# Altium schematic symbol library 13-Logicold 逻辑 IC.SchLib: 297 symbols (part 7 of 30)
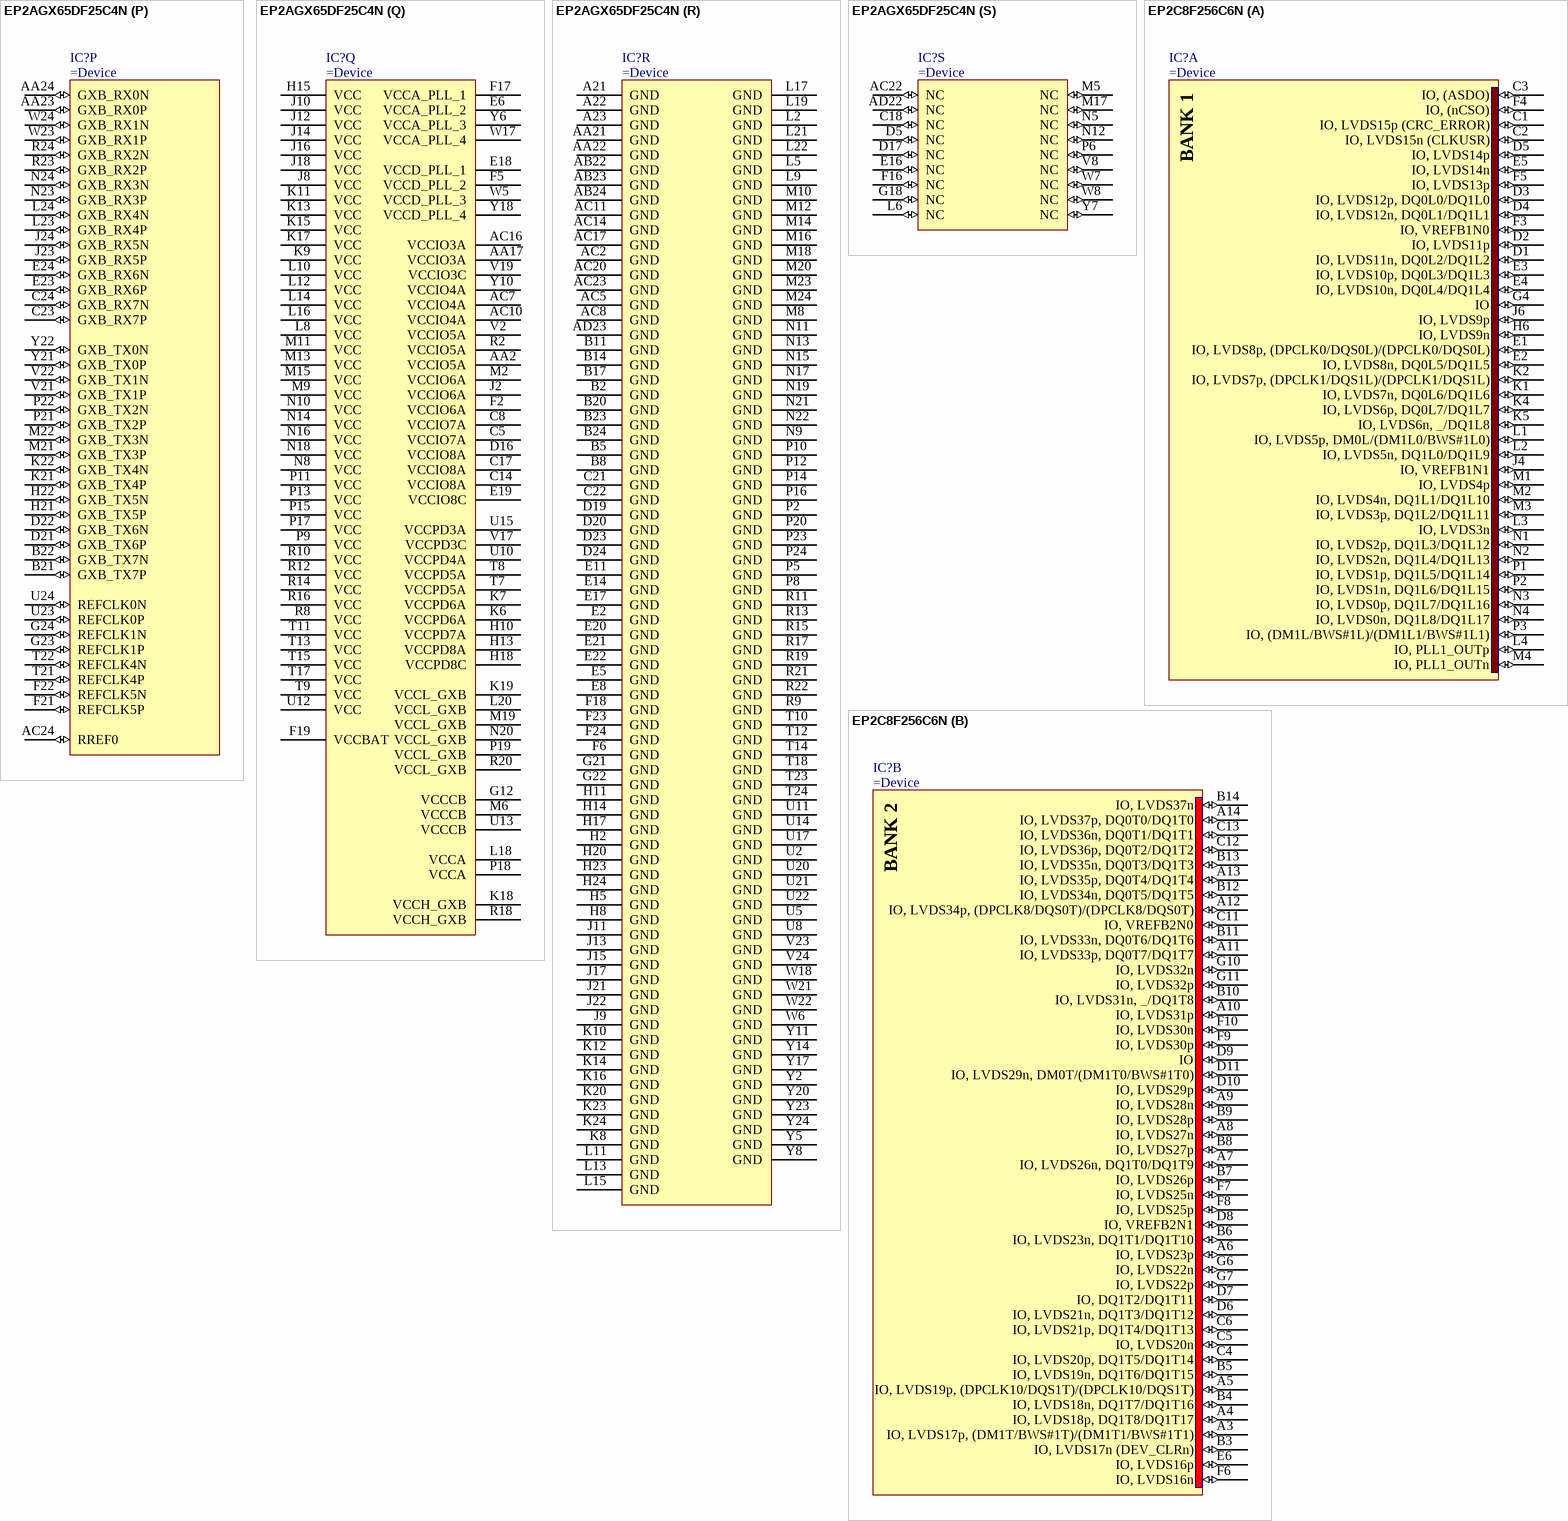
[diagram p168: symbols EP2AGX65DF25C4N to EP2C8F256C6N]

## EP2AGX65DF25C4N
designator IC?
part A pins: AA15 IO/DQ7B/DIFFIO_RX_B4N/DIFFOUT_B4N (io), AA18 IO/DIFFIO_RX_B3P/DIFFOUT_B3P (io), AA19 IO/DIFFIO_RX_B2P/DIFFOUT_B2P/NCEO (io), AB17 IO/DQS7B/DIFFIO_TX_B3P/DIFFIN_B3P (io), AB18 IO/DQ7B/DIFFIO_RX_B3N/DIFFOUT_B3N (io), AB19 IO/DQ8B/DIFFIO_RX_B2N/DIFFOUT_B2N (io), AB21 IO/DQ8B/DIFFIO_TX_B1P/DIFFIN_B1P (io), AC18 IO/DQSN7B/DIFFIO_TX_B3N/DIFFIN_B3N (io), AC21 IO/DQ8B/DIFFIO_TX_B1N/DIFFIN_B1N (io), AD20 IO/DIFFIO_RX_B1P/DIFFOUT_B1P/INIT_DONE (io), AD21 IO/DQ8B/DIFFIO_RX_B1N/DIFFOUT_B1N (io), U16 IO/DQS8B/DIFFIO_TX_B2P/DIFFIN_B2P (io), V15 IO/DIFFIO_TX_B4P/DIFFIN_B4P (io), V16 IO/DQSN8B/DIFFIO_TX_B2N/DIFFIN_B2N (io), W15 IO/DQ7B/DIFFIO_TX_B4N/DIFFIN_B4N (io), Y15 IO/DQ7B/DIFFIO_RX_B4P/DIFFOUT_B4P (io)
part B pins: AA14 IO/DQS5B/DIFFIO_TX_B11P/DIFFIN_B11P (io), AA16 IO/DQ6B/DIFFIO_TX_B9P/DIFFIN_B9P (io), AB14 IO/DQSN5B/DIFFIO_TX_B11N/DIFFIN_B11N (io), AB15 IO/DIFFIO_RX_B11P/DIFFOUT_B11P (io), AB16 IO/DQ6B/DIFFIO_TX_B9N/DIFFIN_B9N (io), AC15 IO/DQ5B/DIFFIO_RX_B11N/DIFFOUT_B11N (io), AC19 IO/DIFFIO_RX_B9P/DIFFOUT_B9P (io), AD15 IO/DQ5B/DIFFIO_RX_B12P/DIFFOUT_B12P (io), AD16 IO/DQ5B/DIFFIO_RX_B12N/DIFFOUT_B12N (io), AD17 IO/DIFFIO_RX_B10P/DIFFOUT_B10P (io), AD18 IO/DQ6B/DIFFIO_RX_B10N/DIFFOUT_B10N (io), AD19 IO/DQ6B/DIFFIO_RX_B9N/DIFFOUT_B9N (io), V13 IO/DIFFIO_TX_B12P/DIFFIN_B12P (io), V14 IO/DQS6B/DIFFIO_TX_B10P/DIFFIN_B10P (io), W13 IO/DQ5B/DIFFIO_TX_B12N/DIFFIN_B12N (io), W14 IO/DQSN6B/DIFFIO_TX_B10N/DIFFIN_B10N (io)
part C pins: AA11 IO/DQS3B/DIFFIO_TX_B15P/DIFFIN_B15P (io), AA12 IO/DQ3B/DIFFIO_RX_B15N/DIFFOUT_B15N (io), AB11 IO/DQSN3B/DIFFIO_TX_B15N/DIFFIN_B15N (io), AB12 IO/DIFFIO_RX_B13P/DIFFOUT_B13P (io), AB13 IO/DQ4B/DIFFIO_TX_B13P/DIFFIN_B13P (io), AC12 IO/DQ4B/DIFFIO_RX_B13N/DIFFOUT_B13N (io), AC13 IO/DQ4B/DIFFIO_TX_B13N/DIFFIN_B13N (io), AD9 IO/DQ3B/DIFFIO_RX_B16P/DIFFOUT_B16P (io), AD10 IO/DQ3B/DIFFIO_RX_B16N/DIFFOUT_B16N (io), AD11 IO/DIFFIO_RX_B14P/DIFFOUT_B14P (io), AD12 IO/DQ4B/DIFFIO_RX_B14N/DIFFOUT_B14N (io), V11 IO/DIFFIO_TX_B16P/DIFFIN_B16P (io), V12 IO/DQS4B/DIFFIO_TX_B14P/DIFFIN_B14P (io), W11 IO/DQ3B/DIFFIO_TX_B16N/DIFFIN_B16N (io), W12 IO/DQSN4B/DIFFIO_TX_B14N/DIFFIN_B14N (io), Y12 IO/DIFFIO_RX_B15P/DIFFOUT_B15P (io)
part D pins: AA6 IO/DIFFIO_RX_B29P/DIFFOUT_B29P (io), AA7 IO/DQS1B/DIFFIO_TX_B23P/DIFFIN_B23P (io), AA8 IO/DIFFIO_RX_B23P/DIFFOUT_B23P (io), AA10 IO/DQ2B/DIFFIO_TX_B21P/DIFFIN_B21P (io), AB6 IO/DIFFIO_RX_B29N/DIFFOUT_B29N (io), AB7 IO/DQSN1B/DIFFIO_TX_B23N/DIFFIN_B23N (io), AB8 IO/DQ1B/DIFFIO_RX_B23N/DIFFOUT_B23N (io), AB9 IO/DIFFIO_RX_B21P/DIFFOUT_B21P (io), AB10 IO/DQ2B/DIFFIO_TX_B21N/DIFFIN_B21N (io), AC6 IO/DQ1B/DIFFIO_RX_B24P/DIFFOUT_B24P (io), AC9 IO/DQ2B/DIFFIO_RX_B21N/DIFFOUT_B21N (io), AD6 IO/DQ1B/DIFFIO_RX_B24N/DIFFOUT_B24N (io), AD7 IO/DIFFIO_RX_B22P/DIFFOUT_B22P (io), AD8 IO/DQ2B/DIFFIO_RX_B22N/DIFFOUT_B22N (io), U9 IO/DIFFIO_TX_B24P/DIFFIN_B24P (io), V9 IO/DQ1B/DIFFIO_TX_B24N/DIFFIN_B24N (io), W9 IO/DQS2B/DIFFIO_TX_B22P/DIFFIN_B22P (io), W10 IO/DQSN2B/DIFFIO_TX_B22N/DIFFIN_B22N (io)
part E pins: AA4 IO/DQS11R/DIFFIO_TX_R3P/DIFFIN_R3P (io), AA5 IO/DIFFIO_RX_R1P/DIFFOUT_R1P (io), AB4 IO/DQSN11R/DIFFIO_TX_R3N/DIFFIN_R3N (io), AB5 IO/DQ12R/DIFFIO_RX_R1N/DIFFOUT_R1N (io), AC3 IO/DQ11R/DIFFIO_RX_R4P/DIFFOUT_R4P (io), AC4 IO/DQ11R/DIFFIO_RX_R4N/DIFFOUT_R4N (io), AD4 IO/DQ12R/DIFFIO_TX_R1P/DIFFIN_R1P (io), AD5 IO/DQ12R/DIFFIO_TX_R1N/DIFFIN_R1N (io), T6 IO/DIFFIO_TX_R4P/DIFFIN_R4P (io), U6 IO/DQ11R/DIFFIO_TX_R4N/DIFFIN_R4N (io), V4 IO/DQ12R/DIFFIO_RX_R2N/DIFFOUT_R2N (io), V5 IO/DIFFIO_RX_R2P/DIFFOUT_R2P (io), V6 IO/DQS12R/DIFFIO_TX_R2P/DIFFIN_R2P (io), V7 IO/DQSN12R/DIFFIO_TX_R2N/DIFFIN_R2N (io), W4 IO/DIFFIO_RX_R3P/DIFFOUT_R3P (io), Y4 IO/DQ11R/DIFFIO_RX_R3N/DIFFOUT_R3N (io)
part F pins: AA1 IO/DQ8R/DIFFIO_TX_R13P/DIFFIN_R13P (io), AA3 IO/DIFFIO_RX_R11P/DIFFOUT_R11P (io), AB1 IO/DQ8R/DIFFIO_TX_R13N/DIFFIN_R13N (io), AB2 IO/DQ9R/DIFFIO_RX_R12P/DIFFOUT_R12P (io), AB3 IO/DQ9R/DIFFIO_RX_R11N/DIFFOUT_R11N (io), AC1 IO/DQ9R/DIFFIO_RX_R12N/DIFFOUT_R12N (io), AD2 IO/DQ10R/DIFFIO_TX_R9P/DIFFIN_R9P (io), AD3 IO/DQ10R/DIFFIO_TX_R9N/DIFFIN_R9N (io), N6 IO/DQ7R/DIFFIO_TX_R16N/DIFFIN_R16N (io), N7 IO/DIFFIO_TX_R16P/DIFFIN_R16P (io), P7 IO/DQS8R/DIFFIO_TX_R14P/DIFFIN_R14P (io), R1 IO/DQ7R/DIFFIO_RX_R16P/DIFFOUT_R16P (io), R3 IO/DQ8R/DIFFIO_RX_R14N/DIFFOUT_R14N (io), R4 IO/DIFFIO_RX_R14P/DIFFOUT_R14P (io), R5 IO/DQ9R/DIFFIO_TX_R12N/DIFFIN_R12N (io), R6 IO/DIFFIO_TX_R12P/DIFFIN_R12P (io), R7 IO/DQSN8R/DIFFIO_TX_R14N/DIFFIN_R14N (io), T1 IO/DQ7R/DIFFIO_RX_R16N/DIFFOUT_R16N (io), T2 IO/DQ8R/DIFFIO_RX_R13N/DIFFOUT_R13N (io), T3 IO/DIFFIO_RX_R13P/DIFFOUT_R13P (io), T4 IO/DQSN10R/DIFFIO_TX_R10N/DIFFIN_R10N (io), T5 IO/DQS10R/DIFFIO_TX_R10P/DIFFIN_R10P (io), U1 IO/DQS7R/DIFFIO_TX_R15P/DIFFIN_R15P (io), U3 IO/DQ10R/DIFFIO_RX_R9N/DIFFOUT_R9N (io), U4 IO/DIFFIO_RX_R9P/DIFFOUT_R9P (io), V1 IO/DQSN7R/DIFFIO_TX_R15N/DIFFIN_R15N (io), V3 IO/DQS9R/DIFFIO_TX_R11P/DIFFIN_R11P (io), W1 IO/DIFFIO_RX_R15P/DIFFOUT_R15P (io), W2 IO/DQSN9R/DIFFIO_TX_R11N/DIFFIN_R11N (io), W3 IO/DIFFIO_RX_R10P/DIFFOUT_R10P (io), Y1 IO/DQ7R/DIFFIO_RX_R15N/DIFFOUT_R15N (io), Y3 IO/DQ10R/DIFFIO_RX_R10N/DIFFOUT_R10N (io)
part G pins: E1 IO/DQS3R/DIFFIO_TX_R23P/DIFFIN_R23P (io), F1 IO/DQSN3R/DIFFIO_TX_R23N/DIFFIN_R23N (io), F3 IO/DQ3R/DIFFIO_RX_R24P/DIFFOUT_R24P (io), G1 IO/DQ4R/DIFFIO_RX_R22N/DIFFOUT_R22N (io), G2 IO/DIFFIO_RX_R22P/DIFFOUT_R22P (io), G3 IO/DQ3R/DIFFIO_RX_R24N/DIFFOUT_R24N (io), H1 IO/DQ4R/DIFFIO_TX_R21P/DIFFIN_R21P (io), H3 IO/DQ3R/DIFFIO_RX_R23N/DIFFOUT_R23N (io), H4 IO/DIFFIO_RX_R23P/DIFFOUT_R23P (io), H6 IO/DQ3R/DIFFIO_TX_R24N/DIFFIN_R24N (io), H7 IO/DIFFIO_TX_R24P/DIFFIN_R24P (io), J1 IO/DQ4R/DIFFIO_TX_R21N/DIFFIN_R21N (io), J3 IO/DQ4R/DIFFIO_RX_R21N/DIFFOUT_R21N (io), J4 IO/DIFFIO_RX_R21P/DIFFOUT_R21P (io), J5 IO/DQSN4R/DIFFIO_TX_R22N/DIFFIN_R22N (io), J6 IO/DQS4R/DIFFIO_TX_R22P/DIFFIN_R22P (io), K1 IO/DQS5R/DIFFIO_TX_R19P/DIFFIN_R19P (io), K2 IO/DQ5R/DIFFIO_RX_R20N/DIFFOUT_R20N (io), K3 IO/DQ5R/DIFFIO_RX_R20P/DIFFOUT_R20P (io), K4 IO/DQ5R/DIFFIO_TX_R20N/DIFFIN_R20N (io), K5 IO/DIFFIO_TX_R20P/DIFFIN_R20P (io), L1 IO/DQSN5R/DIFFIO_TX_R19N/DIFFIN_R19N (io), L3 IO/DQ5R/DIFFIO_RX_R19N/DIFFOUT_R19N (io), L4 IO/DIFFIO_RX_R19P/DIFFOUT_R19P (io), L7 IO/DQS6R/DIFFIO_TX_R18P/DIFFIN_R18P (io), M1 IO/DQ6R/DIFFIO_RX_R18N/DIFFOUT_R18N (io), M3 IO/DQ6R/DIFFIO_RX_R17N/DIFFOUT_R17N (io), M4 IO/DIFFIO_RX_R17P/DIFFOUT_R17P (io), M7 IO/DQSN6R/DIFFIO_TX_R18N/DIFFIN_R18N (io), N1 IO/DQ6R/DIFFIO_TX_R17P/DIFFIN_R17P (io), N2 IO/DIFFIO_RX_R18P/DIFFOUT_R18P (io), P1 IO/DQ6R/DIFFIO_TX_R17N/DIFFIN_R17N (io)
part H pins: B1 IO/DQ1R/DIFFIO_RX_R32P/DIFFOUT_R32P (io), C1 IO/DQ1R/DIFFIO_RX_R32N/DIFFOUT_R32N (io), C2 IO/DQSN1R/DIFFIO_TX_R31N/DIFFIN_R31N (io), C3 IO/DQS1R/DIFFIO_TX_R31P/DIFFIN_R31P (io), D1 IO/DQ2R/DIFFIO_TX_R29N/DIFFIN_R29N/DATA7 (io), D2 IO/DQ2R/DIFFIO_TX_R29P/DIFFIN_R29P/DATA5 (io), D3 IO/DIFFIO_RX_R29P/DIFFOUT_R29P/DATA4 (io), D4 IO/DIFFIO_RX_R31P/DIFFOUT_R31P/DEV_OE (io), E3 IO/DQ2R/DIFFIO_RX_R29N/DIFFOUT_R29N/DATA6 (io), E4 IO/DQ1R/DIFFIO_RX_R31N/DIFFOUT_R31N (io), F4 IO/DIFFIO_RX_R30P/DIFFOUT_R30P/CLKUSR (io), F7 IO/DIFFIO_TX_R32P/DIFFIN_R32P/DEV_CLRN (io), G4 IO/DQ2R/DIFFIO_RX_R30N/DIFFOUT_R30N/DATA2 (io), G5 IO/DQSN2R/DIFFIO_TX_R30N/DIFFIN_R30N/DATA3 (io), G6 IO/DQS2R/DIFFIO_TX_R30P/DIFFIN_R30P/DATA1 (io), G7 IO/DQ1R/DIFFIO_TX_R32N/DIFFIN_R32N (io)
part I pins: A2 IO/DQ7T/DIFFIO_RX_T7N/DIFFOUT_T7N (io), A3 IO/DIFFIO_RX_T7P/DIFFOUT_T7P (io), A4 IO/DQ8T/DIFFIO_RX_T6N/DIFFOUT_T6N (io), A5 IO/DQ7T/DIFFIO_TX_T8N/DIFFIN_T8N (io), A6 IO/DQ7T/DIFFIO_TX_T8P/DIFFIN_T8P (io), B3 IO/DIFFIO_RX_T6P/DIFFOUT_T6P (io), B4 IO/DQSN8T/DIFFIO_TX_T6N/DIFFIN_T6N (io), C4 IO/DQS8T/DIFFIO_TX_T6P/DIFFIN_T6P (io), C6 IO/DQ8T/DIFFIO_RX_T5N/DIFFOUT_T5N (io), C7 IO/DQ7T/DIFFIO_RX_T8N/DIFFOUT_T8N (io), D6 IO/DQ8T/DIFFIO_RX_T5P/DIFFOUT_T5P (io), D8 IO/DIFFIO_RX_T8P/DIFFOUT_T8P (io), E9 IO/DQSN7T/DIFFIO_TX_T7N/DIFFIN_T7N (io), F9 IO/DQS7T/DIFFIO_TX_T7P/DIFFIN_T7P (io), G9 IO/DQ8T/DIFFIO_TX_T5N/DIFFIN_T5N (io), H9 IO/DIFFIO_TX_T5P/DIFFIN_T5P (io)
part J pins: A7 IO/DQ6T/DIFFIO_RX_T14N/DIFFOUT_T14N (io), A8 IO/DIFFIO_RX_T14P/DIFFOUT_T14P (io), A9 IO/DQ5T/DIFFIO_RX_T16N/DIFFOUT_T16N (io), A10 IO/DQ5T/DIFFIO_TX_T16N/DIFFIN_T16N (io), B6 IO/DQSN6T/DIFFIO_TX_T14N/DIFFIN_T14N (io), B7 IO/DQS6T/DIFFIO_TX_T14P/DIFFIN_T14P (io), B9 IO/DIFFIO_RX_T16P/DIFFOUT_T16P (io), B10 IO/DQ5T/DIFFIO_TX_T16P/DIFFIN_T16P (io), C9 IO/DQ6T/DIFFIO_RX_T13N/DIFFOUT_T13N (io), C10 IO/DQ5T/DIFFIO_RX_T15N/DIFFOUT_T15N (io), D9 IO/DQ6T/DIFFIO_RX_T13P/DIFFOUT_T13P (io), D10 IO/DIFFIO_RX_T15P/DIFFOUT_T15P (io), E10 IO/DQSN5T/DIFFIO_TX_T15N/DIFFIN_T15N (io), F10 IO/DQS5T/DIFFIO_TX_T15P/DIFFIN_T15P (io), G10 IO/DQ6T/DIFFIO_TX_T13N/DIFFIN_T13N (io), G11 IO/DIFFIO_TX_T13P/DIFFIN_T13P (io)
part K pins: A11 IO/DQSN4T/DIFFIO_TX_T18N/DIFFIN_T18N (io), A12 IO/DQS4T/DIFFIO_TX_T18P/DIFFIN_T18P (io), A13 IO/DQ3T/DIFFIO_RX_T19N/DIFFOUT_T19N (io), A14 IO/DQ3T/DIFFIO_TX_T20N/DIFFIN_T20N (io), B12 IO/DQ4T/DIFFIO_RX_T18N/DIFFOUT_T18N (io), B13 IO/DIFFIO_RX_T19P/DIFFOUT_T19P (io), B15 IO/DQ3T/DIFFIO_TX_T20P/DIFFIN_T20P (io), C12 IO/DIFFIO_RX_T18P/DIFFOUT_T18P (io), C13 IO/DQ3T/DIFFIO_RX_T20N/DIFFOUT_T20N (io), D12 IO/DQ4T/DIFFIO_RX_T17N/DIFFOUT_T17N (io), D13 IO/DQ4T/DIFFIO_TX_T17N/DIFFIN_T17N (io), D14 IO/DIFFIO_RX_T20P/DIFFOUT_T20P (io), E12 IO/DQ4T/DIFFIO_RX_T17P/DIFFOUT_T17P (io), E13 IO/DIFFIO_TX_T17P/DIFFIN_T17P (io), F13 IO/DQSN3T/DIFFIO_TX_T19N/DIFFIN_T19N (io), G13 IO/DQS3T/DIFFIO_TX_T19P/DIFFIN_T19P (io)
part L pins: A15 IO/DQSN2T/DIFFIO_TX_T26N/DIFFIN_T26N (io), A16 IO/DQS2T/DIFFIO_TX_T26P/DIFFIN_T26P (io), A17 IO/DQ1T/DIFFIO_RX_T27N/DIFFOUT_T27N (io), A18 IO/DIFFIO_RX_T27P/DIFFOUT_T27P (io), A19 IO/DQ1T/DIFFIO_TX_T28N/DIFFIN_T28N (io), A20 IO/DQ1T/DIFFIO_TX_T28P/DIFFIN_T28P (io), B16 IO/DQ2T/DIFFIO_RX_T26N/DIFFOUT_T26N (io), B18 IO/DQ1T/DIFFIO_RX_T28N/DIFFOUT_T28N (io), C15 IO/DQ2T/DIFFIO_RX_T25N/DIFFOUT_T25N (io), C16 IO/DIFFIO_RX_T26P/DIFFOUT_T26P (io), C19 IO/DIFFIO_RX_T28P/DIFFOUT_T28P/CRC_ERROR (io), D15 IO/DQ2T/DIFFIO_RX_T25P/DIFFOUT_T25P (io), E15 IO/DQSN1T/DIFFIO_TX_T27N/DIFFIN_T27N (io), F14 IO/DQ2T/DIFFIO_TX_T25N/DIFFIN_T25N (io), F15 IO/DQS1T/DIFFIO_TX_T27P/DIFFIN_T27P (io), G14 IO/DIFFIO_TX_T25P/DIFFIN_T25P (io)
part M pins: AA13 CLK4_DIFFCLK_0N (io), AD13 CLK7_DIFFCLK_1P (io), AD14 CLK5_DIFFCLK_1N (io), C11 CLK14_DIFFCLK_4N (io), D11 CLK12_DIFFCLK_4P (io), F11 CLK15_DIFFCLK_5N (io), F12 CLK13_DIFFCLK_5P (io), G15 VREFB8AN0 (io), H12 VREFB7AN0 (io), J7 VREFB6AN0 (io), N3 CLK9_DIFFCLK_3N (io), N4 CLK11_DIFFCLK_3P (io), P3 CLK8_DIFFCLK_2N (io), P4 CLK10_DIFFCLK_2P (io), T16 VREFB3AN0 (io), U7 VREFB5AN0 (io), V10 VREFB4AN0 (io), Y13 CLK6_DIFFCLK_0P (io)
part N pins: D18 TCK (io), F20 DCLK (io), G17 TMS (io), G19 TDI (io), G20 TDO (io), H19 NCSO (io), J19 DATA0 (io), J20 ASDO (io), T19 MSEL1 (io), T20 MSEL3 (io), U18 NSTATUS (io), U19 NIO_PULLUP (io), V18 NCE (io), V20 NCONFIG (io), W19 CONF_DONE (io), W20 MSEL2 (io), Y19 MSEL0 (io)
part O pins: AA9 PLL3_CLKOUT1N (io), AA20 RUP0 (io), AB20 RDN0 (io), B19 RDN2 (io), C20 RUP2 (io), D7 RDN1 (io), E7 RUP1 (io), F8 PLL2_CLKOUT1N (io), G8 PLL2_CLKOUT1P (io), G16 PLL1_CLKOUT1N (io), H16 PLL1_CLKOUT1P (io), W16 PLL4_CLKOUT1P (io), Y9 PLL3_CLKOUT1P (io), Y16 PLL4_CLKOUT1N (io)
part P pins: AA23 GXB_RX0P (io), AA24 GXB_RX0N (io), AC24 RREF0 (io), B21 GXB_TX7P (io), B22 GXB_TX7N (io), C23 GXB_RX7P (io), C24 GXB_RX7N (io), D21 GXB_TX6P (io), D22 GXB_TX6N (io), E23 GXB_RX6P (io), E24 GXB_RX6N (io), F21 REFCLK5P (io), F22 REFCLK5N (io), G23 REFCLK1P (io), G24 REFCLK1N (io), H21 GXB_TX5P (io), H22 GXB_TX5N (io), J23 GXB_RX5P (io), J24 GXB_RX5N (io), K21 GXB_TX4P (io), K22 GXB_TX4N (io), L23 GXB_RX4P (io), L24 GXB_RX4N (io), M21 GXB_TX3P (io), M22 GXB_TX3N (io), N23 GXB_RX3P (io), N24 GXB_RX3N (io), P21 GXB_TX2P (io), P22 GXB_TX2N (io), R23 GXB_RX2P (io), R24 GXB_RX2N (io), T21 REFCLK4P (io), T22 REFCLK4N (io), U23 REFCLK0P (io), U24 REFCLK0N (io), V21 GXB_TX1P (io), V22 GXB_TX1N (io), W23 GXB_RX1P (io), W24 GXB_RX1N (io), Y21 GXB_TX0P (io), Y22 GXB_TX0N (io)
part Q pins: AA2 VCCIO5A (power), AA17 VCCIO3A (power), AC7 VCCIO4A (power), AC10 VCCIO4A (power), AC16 VCCIO3A (power), C5 VCCIO7A (power), C8 VCCIO7A (power), C14 VCCIO8A (power), C17 VCCIO8A (power), D16 VCCIO8A (power), E6 VCCA_PLL_2 (power), E18 VCCD_PLL_1 (power), E19 VCCIO8C (power), F2 VCCIO6A (power), F5 VCCD_PLL_2 (power), F17 VCCA_PLL_1 (power), F19 VCCBAT (power), G12 VCCCB (power), H10 VCCPD7A (power), H13 VCCPD8A (power), H15 VCC (power), H18 VCCPD8C (power), J2 VCCIO6A (power), J8 VCC (power), J10 VCC (power), J12 VCC (power), J14 VCC (power), J16 VCC (power), J18 VCC (power), K6 VCCPD6A (power), K7 VCCPD6A (power), K9 VCC (power), K11 VCC (power), K13 VCC (power), K15 VCC (power), K17 VCC (power), K18 VCCH_GXB (power), K19 VCCL_GXB (power), L8 VCC (power), L10 VCC (power), L12 VCC (power), L14 VCC (power), L16 VCC (power), L18 VCCA (power), L20 VCCL_GXB (power), M2 VCCIO6A (power), M6 VCCCB (power), M9 VCC (power), M11 VCC (power), M13 VCC (power), M15 VCC (power), M19 VCCL_GXB (power), N8 VCC (power), N10 VCC (power), N14 VCC (power), N16 VCC (power), N18 VCC (power), N20 VCCL_GXB (power), P9 VCC (power), P11 VCC (power), P13 VCC (power), P15 VCC (power), P17 VCC (power), P18 VCCA (power), P19 VCCL_GXB (power), R2 VCCIO5A (power), R8 VCC (power), R10 VCC (power), R12 VCC (power), R14 VCC (power), R16 VCC (power), R18 VCCH_GXB (power), R20 VCCL_GXB (power), T7 VCCPD5A (power), T8 VCCPD5A (power), T9 VCC (power), T11 VCC (power), T13 VCC (power), T15 VCC (power), T17 VCC (power), U10 VCCPD4A (power), U12 VCC (power), U13 VCCCB (power), U15 VCCPD3A (power), V2 VCCIO5A (power), V17 VCCPD3C (power), V19 VCCIO3C (power), W5 VCCD_PLL_3 (power), W17 VCCA_PLL_4 (power), Y6 VCCA_PLL_3 (power), Y10 VCCIO4A (power), Y18 VCCD_PLL_4 (power)
part R pins: A21 GND (power), A22 GND (power), A23 GND (power), AA21 GND (power), AA22 GND (power), AB22 GND (power), AB23 GND (power), AB24 GND (power), AC2 GND (power), AC5 GND (power), AC8 GND (power), AC11 GND (power), AC14 GND (power), AC17 GND (power), AC20 GND (power), AC23 GND (power), AD23 GND (power), B2 GND (power), B5 GND (power), B8 GND (power), B11 GND (power), B14 GND (power), B17 GND (power), B20 GND (power), B23 GND (power), B24 GND (power), C21 GND (power), C22 GND (power), D19 GND (power), D20 GND (power), D23 GND (power), D24 GND (power), E2 GND (power), E5 GND (power), E8 GND (power), E11 GND (power), E14 GND (power), E17 GND (power), E20 GND (power), E21 GND (power), E22 GND (power), F6 GND (power), F18 GND (power), F23 GND (power), F24 GND (power), G21 GND (power), G22 GND (power), H2 GND (power), H5 GND (power), H8 GND (power), H11 GND (power), H14 GND (power), H17 GND (power), H20 GND (power), H23 GND (power), H24 GND (power), J9 GND (power), J11 GND (power), J13 GND (power), J15 GND (power), J17 GND (power), J21 GND (power), J22 GND (power), K8 GND (power), K10 GND (power), K12 GND (power), K14 GND (power), K16 GND (power), K20 GND (power), K23 GND (power), K24 GND (power), L2 GND (power), L5 GND (power), L9 GND (power), L11 GND (power), L13 GND (power), L15 GND (power), L17 GND (power), L19 GND (power), L21 GND (power), L22 GND (power), M8 GND (power), M10 GND (power), M12 GND (power), M14 GND (power), M16 GND (power), M18 GND (power), M20 GND (power), M23 GND (power), M24 GND (power), N9 GND (power), N11 GND (power), N13 GND (power), N15 GND (power), N17 GND (power), N19 GND (power), N21 GND (power), N22 GND (power), P2 GND (power), P5 GND (power), P8 GND (power), P10 GND (power), P12 GND (power), P14 GND (power), P16 GND (power), P20 GND (power), P23 GND (power), P24 GND (power), R9 GND (power), R11 GND (power), R13 GND (power), R15 GND (power), R17 GND (power), R19 GND (power), R21 GND (power), R22 GND (power), T10 GND (power), T12 GND (power), T14 GND (power), T18 GND (power), T23 GND (power), T24 GND (power), U2 GND (power), U5 GND (power), U8 GND (power), U11 GND (power), U14 GND (power), U17 GND (power), U20 GND (power), U21 GND (power), U22 GND (power), V23 GND (power), V24 GND (power), W6 GND (power), W18 GND (power), W21 GND (power), W22 GND (power), Y2 GND (power), Y5 GND (power), Y8 GND (power), Y11 GND (power), Y14 GND (power), Y17 GND (power), Y20 GND (power), Y23 GND (power), Y24 GND (power)
part S pins: AC22 NC (io), AD22 NC (io), C18 NC (io), D5 NC (io), D17 NC (io), E16 NC (io), F16 NC (io), G18 NC (io), L6 NC (io), M5 NC (io), M17 NC (io), N5 NC (io), N12 NC (io), P6 NC (io), V8 NC (io), W7 NC (io), W8 NC (io), Y7 NC (io)
part A text: BANK 3A
part B text: BANK 3A
part C text: BANK 4A
part D text: BANK 4A
part E text: BANK 5A
part F text: BANK 5A
part G text: BANK 6A
part H text: BANK 6A
part I text: BANK 7A
part J text: BANK 7A
part K text: BANK 8A
part L text: BANK 8A

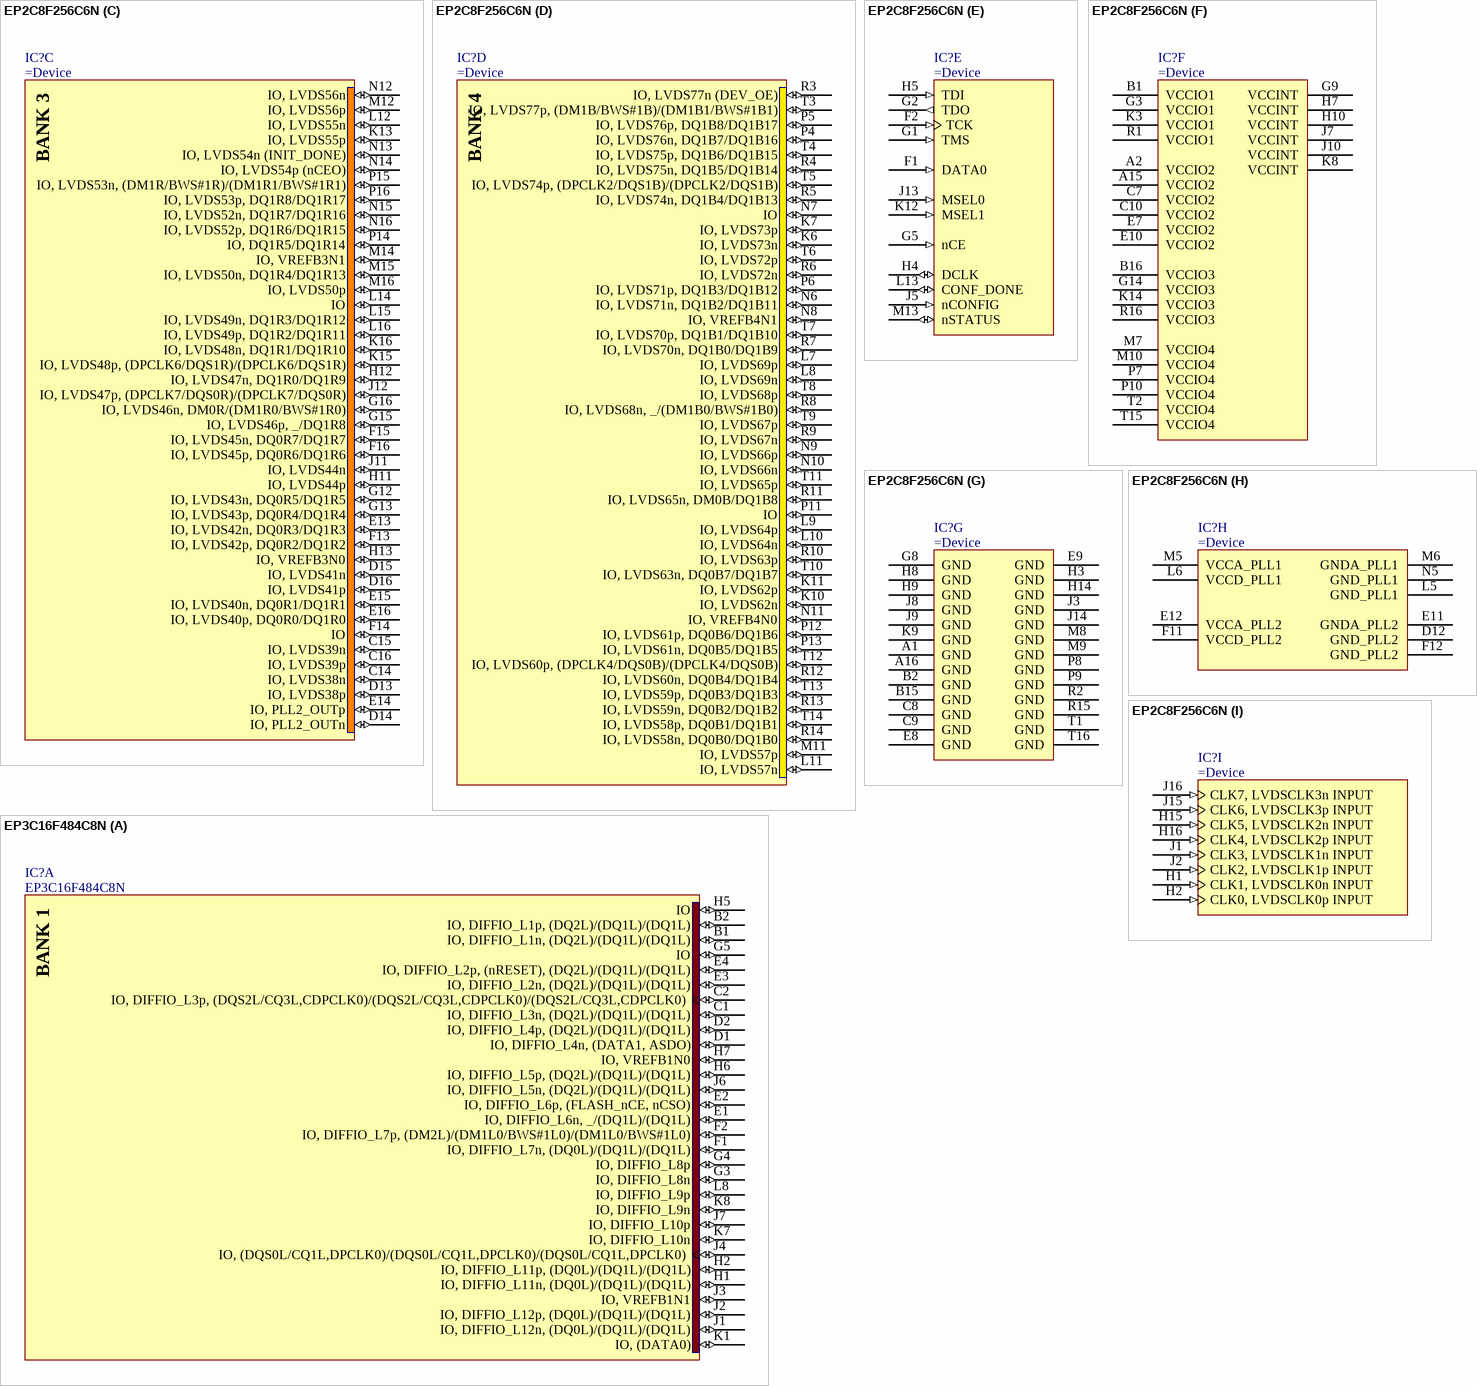
[diagram p39: symbols EP2C8F256C6N to EP3C16F484C8N]

## EP2C8F256C6N
designator IC?
Cyclone II Family, 1.2V FPGA, 182 I/O Pins, 2 PLLs, 256-Pin FBGA, Speed Grade 6, Commercial Grade, Pb-Free
part A pins: C1 IO, LVDS15p (CRC_ERROR) (io), C2 IO, LVDS15n (CLKUSR) (io), C3 IO, (ASDO) (io), D1 IO, LVDS11n, DQ0L2/DQ1L2 (io), D2 IO, LVDS11p (io), D3 IO, LVDS12p, DQ0L0/DQ1L0 (io), D4 IO, LVDS12n, DQ0L1/DQ1L1 (io), D5 IO, LVDS14p (io), E1 IO, LVDS8p, (DPCLK0/DQS0L)/(DPCLK0/DQS0L) (io), E2 IO, LVDS8n, DQ0L5/DQ1L5 (io), E3 IO, LVDS10p, DQ0L3/DQ1L3 (io), E4 IO, LVDS10n, DQ0L4/DQ1L4 (io), E5 IO, LVDS14n (io), F3 IO, VREFB1N0 (io), F4 IO, (nCSO) (io), F5 IO, LVDS13p (io), G4 IO (io), H6 IO, LVDS9n (io), J4 IO, VREFB1N1 (io), J6 IO, LVDS9p (io), K1 IO, LVDS7n, DQ0L6/DQ1L6 (io), K2 IO, LVDS7p, (DPCLK1/DQS1L)/(DPCLK1/DQS1L) (io), K4 IO, LVDS6p, DQ0L7/DQ1L7 (io), K5 IO, LVDS6n, _/DQ1L8 (io), L1 IO, LVDS5p, DM0L/(DM1L0/BWS#1L0) (io), L2 IO, LVDS5n, DQ1L0/DQ1L9 (io), L3 IO, LVDS3n (io), L4 IO, PLL1_OUTp (io), M1 IO, LVDS4p (io), M2 IO, LVDS4n, DQ1L1/DQ1L10 (io), M3 IO, LVDS3p, DQ1L2/DQ1L11 (io), M4 IO, PLL1_OUTn (io), N1 IO, LVDS2p, DQ1L3/DQ1L12 (io), N2 IO, LVDS2n, DQ1L4/DQ1L13 (io), N3 IO, LVDS0p, DQ1L7/DQ1L16 (io), N4 IO, LVDS0n, DQ1L8/DQ1L17 (io), P1 IO, LVDS1p, DQ1L5/DQ1L14 (io), P2 IO, LVDS1n, DQ1L6/DQ1L15 (io), P3 IO, (DM1L/BWS#1L)/(DM1L1/BWS#1L1) (io)
part B pins: A3 IO, LVDS17p, (DM1T/BWS#1T)/(DM1T1/BWS#1T1) (io), A4 IO, LVDS18p, DQ1T8/DQ1T17 (io), A5 IO, LVDS19p, (DPCLK10/DQS1T)/(DPCLK10/DQS1T) (io), A6 IO, LVDS23p (io), A7 IO, LVDS26n, DQ1T0/DQ1T9 (io), A8 IO, LVDS27n (io), A9 IO, LVDS28n (io), A10 IO, LVDS31p (io), A11 IO, LVDS33p, DQ0T7/DQ1T7 (io), A12 IO, LVDS34p, (DPCLK8/DQS0T)/(DPCLK8/DQS0T) (io), A13 IO, LVDS35p, DQ0T4/DQ1T4 (io), A14 IO, LVDS37p, DQ0T0/DQ1T0 (io), B3 IO, LVDS17n (DEV_CLRn) (io), B4 IO, LVDS18n, DQ1T7/DQ1T16 (io), B5 IO, LVDS19n, DQ1T6/DQ1T15 (io), B6 IO, LVDS23n, DQ1T1/DQ1T10 (io), B7 IO, LVDS26p (io), B8 IO, LVDS27p (io), B9 IO, LVDS28p (io), B10 IO, LVDS31n, _/DQ1T8 (io), B11 IO, LVDS33n, DQ0T6/DQ1T6 (io), B12 IO, LVDS34n, DQ0T5/DQ1T5 (io), B13 IO, LVDS35n, DQ0T3/DQ1T3 (io), B14 IO, LVDS37n (io), C4 IO, LVDS20p, DQ1T5/DQ1T14 (io), C5 IO, LVDS20n (io), C6 IO, LVDS21p, DQ1T4/DQ1T13 (io), C11 IO, VREFB2N0 (io), C12 IO, LVDS36p, DQ0T2/DQ1T2 (io), C13 IO, LVDS36n, DQ0T1/DQ1T1 (io), D6 IO, LVDS21n, DQ1T3/DQ1T12 (io), D7 IO, DQ1T2/DQ1T11 (io), D8 IO, VREFB2N1 (io), D9 IO (io), D10 IO, LVDS29p (io), D11 IO, LVDS29n, DM0T/(DM1T0/BWS#1T0) (io), E6 IO, LVDS16p (io), F6 IO, LVDS16n (io), F7 IO, LVDS25n (io), F8 IO, LVDS25p (io), F9 IO, LVDS30p (io), F10 IO, LVDS30n (io), G6 IO, LVDS22n (io), G7 IO, LVDS22p (io), G10 IO, LVDS32n (io), G11 IO, LVDS32p (io)
part C pins: C14 IO, LVDS38n (io), C15 IO, LVDS39n (io), C16 IO, LVDS39p (io), D13 IO, LVDS38p (io), D14 IO, PLL2_OUTn (io), D15 IO, LVDS41n (io), D16 IO, LVDS41p (io), E13 IO, LVDS42n, DQ0R3/DQ1R3 (io), E14 IO, PLL2_OUTp (io), E15 IO, LVDS40n, DQ0R1/DQ1R1 (io), E16 IO, LVDS40p, DQ0R0/DQ1R0 (io), F13 IO, LVDS42p, DQ0R2/DQ1R2 (io), F14 IO (io), F15 IO, LVDS45n, DQ0R7/DQ1R7 (io), F16 IO, LVDS45p, DQ0R6/DQ1R6 (io), G12 IO, LVDS43n, DQ0R5/DQ1R5 (io), G13 IO, LVDS43p, DQ0R4/DQ1R4 (io), G15 IO, LVDS46p, _/DQ1R8 (io), G16 IO, LVDS46n, DM0R/(DM1R0/BWS#1R0) (io), H11 IO, LVDS44p (io), H12 IO, LVDS47n, DQ1R0/DQ1R9 (io), H13 IO, VREFB3N0 (io), J11 IO, LVDS44n (io), J12 IO, LVDS47p, (DPCLK7/DQS0R)/(DPCLK7/DQS0R) (io), K13 IO, LVDS55p (io), K15 IO, LVDS48p, (DPCLK6/DQS1R)/(DPCLK6/DQS1R) (io), K16 IO, LVDS48n, DQ1R1/DQ1R10 (io), L12 IO, LVDS55n (io), L14 IO (io), L15 IO, LVDS49n, DQ1R3/DQ1R12 (io), L16 IO, LVDS49p, DQ1R2/DQ1R11 (io), M12 IO, LVDS56p (io), M14 IO, VREFB3N1 (io), M15 IO, LVDS50n, DQ1R4/DQ1R13 (io), M16 IO, LVDS50p (io), N12 IO, LVDS56n (io), N13 IO, LVDS54n (INIT_DONE) (io), N14 IO, LVDS54p (nCEO) (io), N15 IO, LVDS52n, DQ1R7/DQ1R16 (io), N16 IO, LVDS52p, DQ1R6/DQ1R15 (io), P14 IO, DQ1R5/DQ1R14 (io), P15 IO, LVDS53n, (DM1R/BWS#1R)/(DM1R1/BWS#1R1) (io), P16 IO, LVDS53p, DQ1R8/DQ1R17 (io)
part D pins: K6 IO, LVDS73n (io), K7 IO, LVDS73p (io), K10 IO, LVDS62n (io), K11 IO, LVDS62p (io), L7 IO, LVDS69p (io), L8 IO, LVDS69n (io), L9 IO, LVDS64p (io), L10 IO, LVDS64n (io), L11 IO, LVDS57n (io), M11 IO, LVDS57p (io), N6 IO, LVDS71n, DQ1B2/DQ1B11 (io), N7 IO (io), N8 IO, VREFB4N1 (io), N9 IO, LVDS66p (io), N10 IO, LVDS66n (io), N11 IO, VREFB4N0 (io), P4 IO, LVDS76n, DQ1B7/DQ1B16 (io), P5 IO, LVDS76p, DQ1B8/DQ1B17 (io), P6 IO, LVDS71p, DQ1B3/DQ1B12 (io), P11 IO (io), P12 IO, LVDS61p, DQ0B6/DQ1B6 (io), P13 IO, LVDS61n, DQ0B5/DQ1B5 (io), R3 IO, LVDS77n (DEV_OE) (io), R4 IO, LVDS75n, DQ1B5/DQ1B14 (io), R5 IO, LVDS74n, DQ1B4/DQ1B13 (io), R6 IO, LVDS72n (io), R7 IO, LVDS70n, DQ1B0/DQ1B9 (io), R8 IO, LVDS68n, _/(DM1B0/BWS#1B0) (io), R9 IO, LVDS67n (io), R10 IO, LVDS63p (io), R11 IO, LVDS65n, DM0B/DQ1B8 (io), R12 IO, LVDS60n, DQ0B4/DQ1B4 (io), R13 IO, LVDS59n, DQ0B2/DQ1B2 (io), R14 IO, LVDS58n, DQ0B0/DQ1B0 (io), T3 IO, LVDS77p, (DM1B/BWS#1B)/(DM1B1/BWS#1B1) (io), T4 IO, LVDS75p, DQ1B6/DQ1B15 (io), T5 IO, LVDS74p, (DPCLK2/DQS1B)/(DPCLK2/DQS1B) (io), T6 IO, LVDS72p (io), T7 IO, LVDS70p, DQ1B1/DQ1B10 (io), T8 IO, LVDS68p (io), T9 IO, LVDS67p (io), T10 IO, LVDS63n, DQ0B7/DQ1B7 (io), T11 IO, LVDS65p (io), T12 IO, LVDS60p, (DPCLK4/DQS0B)/(DPCLK4/DQS0B) (io), T13 IO, LVDS59p, DQ0B3/DQ1B3 (io), T14 IO, LVDS58p, DQ0B1/DQ1B1 (io)
part E pins: F1 DATA0 (in), F2 TCK (in), G1 TMS (in), G2 TDO (out), G5 nCE (in), H4 DCLK (io), H5 TDI (in), J5 nCONFIG (in), J13 MSEL0 (in), K12 MSEL1 (in), L13 CONF_DONE (io), M13 nSTATUS (io)
part F pins: A2 VCCIO2 (power), A15 VCCIO2 (power), B1 VCCIO1 (power), B16 VCCIO3 (power), C7 VCCIO2 (power), C10 VCCIO2 (power), E7 VCCIO2 (power), E10 VCCIO2 (power), G3 VCCIO1 (power), G9 VCCINT (power), G14 VCCIO3 (power), H7 VCCINT (power), H10 VCCINT (power), J7 VCCINT (power), J10 VCCINT (power), K3 VCCIO1 (power), K8 VCCINT (power), K14 VCCIO3 (power), M7 VCCIO4 (power), M10 VCCIO4 (power), P7 VCCIO4 (power), P10 VCCIO4 (power), R1 VCCIO1 (power), R16 VCCIO3 (power), T2 VCCIO4 (power), T15 VCCIO4 (power)
part G pins: A1 GND (power), A16 GND (power), B2 GND (power), B15 GND (power), C8 GND (power), C9 GND (power), E8 GND (power), E9 GND (power), G8 GND (power), H3 GND (power), H8 GND (power), H9 GND (power), H14 GND (power), J3 GND (power), J8 GND (power), J9 GND (power), J14 GND (power), K9 GND (power), M8 GND (power), M9 GND (power), P8 GND (power), P9 GND (power), R2 GND (power), R15 GND (power), T1 GND (power), T16 GND (power)
part H pins: D12 GND_PLL2 (power), E11 GNDA_PLL2 (power), E12 VCCA_PLL2 (power), F11 VCCD_PLL2 (power), F12 GND_PLL2 (power), L5 GND_PLL1 (power), L6 VCCD_PLL1 (power), M5 VCCA_PLL1 (power), M6 GNDA_PLL1 (power), N5 GND_PLL1 (power)
part I pins: H1 CLK1, LVDSCLK0n INPUT (in), H2 CLK0, LVDSCLK0p INPUT (in), H15 CLK5, LVDSCLK2n INPUT (in), H16 CLK4, LVDSCLK2p INPUT (in), J1 CLK3, LVDSCLK1n INPUT (in), J2 CLK2, LVDSCLK1p INPUT (in), J15 CLK6, LVDSCLK3p INPUT (in), J16 CLK7, LVDSCLK3n INPUT (in)
